# Altium footprint library FujinLib.PcbLib: 106 footprints (part 3 of 7)
Each footprint in its own frame and in the unit in brackets; x right, y up, seen from the top. Pads: shape width x height; smd on the part's side, far side on the other; paste and mask are expansions set on the pad; w line width, h text height; cw(c..) or ccw(c..) is an arc to the next point about the centre after c.
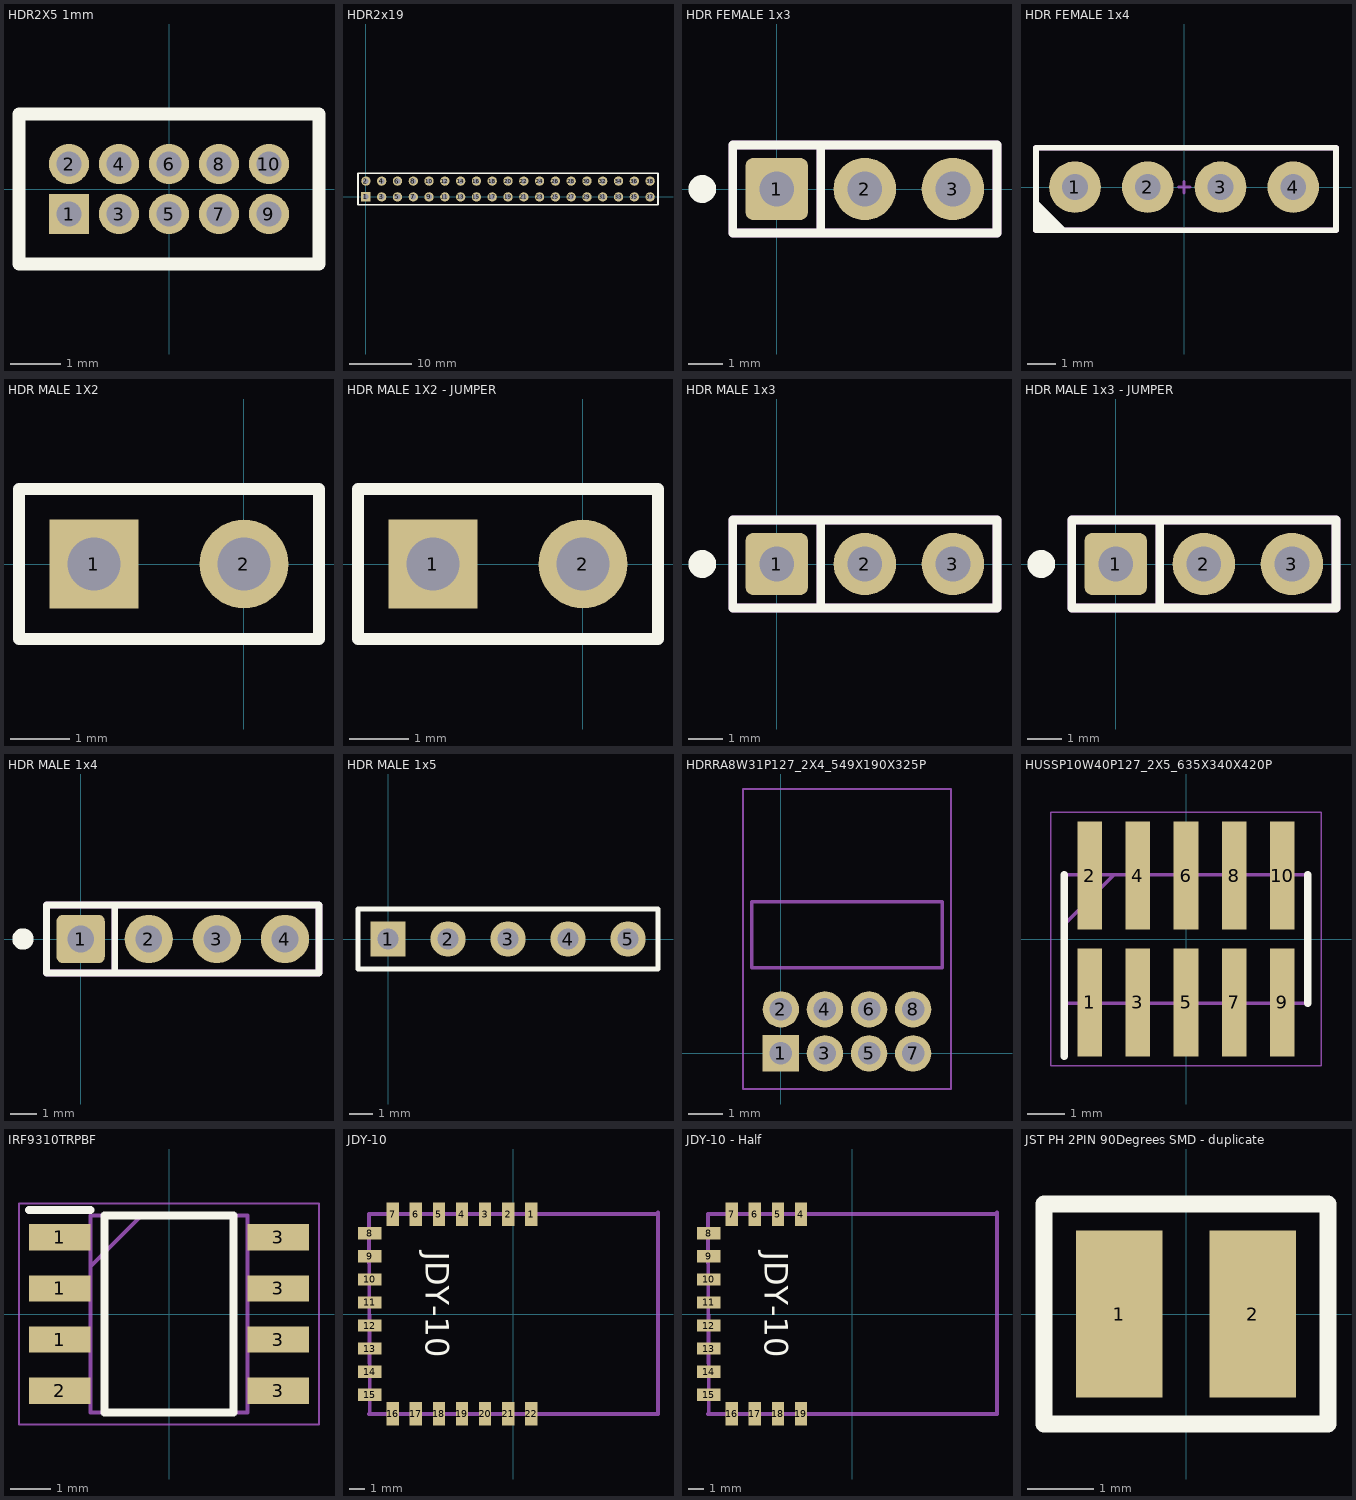
[diagram p2: the footprints below, top view; thin cyan lines are the x and y axes]

## HDR2X5 1mm [mm] "HDR2X5 1mm"
pads (10):
  rect 0.8x0.8 hole 0.5: 1(-2,-0.5)
  round 0.8 hole 0.5: 2(-2,0.5) 3(-1,-0.5) 4(-1,0.5) 5(0,-0.5) 6(0,0.5) 7(1,-0.5) 8(1,0.5) 9(2,-0.5) 10(2,0.5)
Top Overlay:
  lines w0.254: -3,-1.5 -3,1.5 3,1.5 3,-1.5 -3,-1.5

## HDR2x19 [mm]
pads (38):
  rect 1.5x1.5 hole 0.9: 1(0,0)
  round 1.5 hole 0.9: 2(0,2.54) 3(2.54,0) 4(2.54,2.54) 5(5.08,0) 6(5.08,2.54) 7(7.62,0) 8(7.62,2.54) 9(10.16,0) 10(10.16,2.54) 11(12.7,0) 12(12.7,2.54) 13(15.24,0) 14(15.24,2.54) 15(17.78,0) 16(17.78,2.54) 17(20.32,0) 18(20.32,2.54) 19(22.86,0) 20(22.86,2.54) 21(25.4,0) 22(25.4,2.54) 23(27.94,0) 24(27.94,2.54) 25(30.48,0) 26(30.48,2.54) 27(33.02,0) 28(33.02,2.54) 29(35.56,0) 30(35.56,2.54) 31(38.1,0) 32(38.1,2.54) 33(40.64,0) 34(40.64,2.54) 35(43.18,0) 36(43.18,2.54) 37(45.72,0) 38(45.72,2.54)
Top Overlay:
  lines w0.254: -1.27,-1.27 -1.27,3.81 46.99,3.81 46.99,-1.27 -1.27,-1.27
3D body "female_header_a-bl254-dg-g38d.stp": height 8.5, standoff -3.2, extent -1.395,-1.23 47.115,3.77

## HDR FEMALE 1x3 [mm] "PinHeader 1x3 TH Pitch 2.54mm"
height 9.5
pads (3):
  rrect25% 1.8x1.8 hole 1: 1(0,0)
  round 1.8 hole 1: 2(2.54,0) 3(5.08,0)
Top Overlay:
  circle w0.5: c-2.15,0 r0.15
  lines w0.254: 1.27,-1.27 1.27,1.27 -1.27,1.27 ; -1.27,1.27 6.35,1.27 6.35,-1.27 -1.27,-1.27 -1.27,1.27
Mechanical 3:
  lines w0.254: 1.27,-1.27 1.27,1.27 -1.27,1.27 ; -1.27,1.27 6.35,1.27 6.35,-1.27 -1.27,-1.27 -1.27,1.27
3D body "female_header_a-bl254-eg-g03d.stp": height 8.5, standoff -3.2, extent -1.435,-1.3 6.435,1.2

## HDR FEMALE 1x4 [mm] "Connector; Header; 4 Position"
pads (4):
  round 1.8 hole 0.9: 1(-3.81,0) 2(-1.27,0) 3(1.27,0) 4(3.81,0)
Top Overlay:
  region: -5.17,-1.5 -4.572,-1.5 -4.088,-1.5 -5.17,-0.418
  lines w0.2: -5.17,-1.5 5.3,-1.5 5.3,1.37 -5.17,1.37 -5.17,-1.5
Mechanical 15:
  lines w0.1: -0.2,0 0.2,0 ; 0,-0.2 0,0.2
  lines w0.2: -5.17,-1.5 -5.17,1.37 5.3,1.37 5.3,-1.5 -5.17,-1.5
Mechanical 29:
  text "1" at -2.794,-1.143 h0.5
3D body "HDR FEMALE 1x4.STEP": height 8.5, standoff -2.09, extent -5,-1.3 5.16,1.24

## HDR MALE 1X2 [mm]
pads (2):
  rect 1.5x1.5 hole 0.9: 1(-2.54,0)
  round 1.5 hole 0.9: 2(0,0)
Top Overlay:
  lines w0.2: -3.81,-1.27 -3.81,1.27 1.27,1.27 1.27,-1.27 -3.81,-1.27
3D body "pin_header_aw140-eg-g02d.stp": height 8.2, standoff -3, extent -3.91,-1.253 1.17,1.246

## HDR MALE 1X2 - JUMPER [mm]
pads (2):
  rect 1.5x1.5 hole 0.9: 1(-2.54,0)
  round 1.5 hole 0.9: 2(0,0)
Top Overlay:
  lines w0.2: -3.81,-1.27 -3.81,1.27 1.27,1.27 1.27,-1.27 -3.81,-1.27
3D body "pin_header_aw140-eg-g02d.stp": height 8.2, standoff -3, extent -3.91,-1.253 1.17,1.246
3D body "jumper_aksnt_g-black.stp": height 7.25, standoff 2.75, extent -3.77,-1.2 1.23,1.2

## HDR MALE 1x3 [mm] "PinHeader 1x3 TH Pitch 2.54mm"
height 9.5
pads (3):
  rrect25% 1.8x1.8 hole 1: 1(0,0)
  round 1.8 hole 1: 2(2.54,0) 3(5.08,0)
Top Overlay:
  circle w0.5: c-2.15,0 r0.15
  lines w0.254: 1.27,-1.27 1.27,1.27 -1.27,1.27 ; -1.27,1.27 6.35,1.27 6.35,-1.27 -1.27,-1.27 -1.27,1.27
Mechanical 3:
  lines w0.254: 1.27,-1.27 1.27,1.27 -1.27,1.27 ; -1.27,1.27 6.35,1.27 6.35,-1.27 -1.27,-1.27 -1.27,1.27
3D body "Pin Header 1x3 TH Pitch 2.54mm.stp": height 9.5, standoff -3.2, extent -1.27,-1.27 6.35,1.27

## HDR MALE 1x3 - JUMPER [mm] "PinHeader 1x3 TH Pitch 2.54mm"
height 9.5
pads (3):
  rrect25% 1.8x1.8 hole 1: 1(0,0)
  round 1.8 hole 1: 2(2.54,0) 3(5.08,0)
Top Overlay:
  circle w0.5: c-2.15,0 r0.15
  lines w0.254: 1.27,-1.27 1.27,1.27 -1.27,1.27 ; -1.27,1.27 6.35,1.27 6.35,-1.27 -1.27,-1.27 -1.27,1.27
Mechanical 3:
  lines w0.254: 1.27,-1.27 1.27,1.27 -1.27,1.27 ; -1.27,1.27 6.35,1.27 6.35,-1.27 -1.27,-1.27 -1.27,1.27
3D body "jumper_aksnt_g-black.stp": height 7.25, standoff 2.75, extent -1.23,-1.2 3.77,1.2
3D body "Pin Header 1x3 TH Pitch 2.54mm.stp": height 9.5, standoff -3.2, extent -1.27,-1.27 6.35,1.27

## HDR MALE 1x4 [mm] "PinHeader 1x4 TH Pitch 2.54mm"
height 9.5
pads (4):
  rrect25% 1.8x1.8 hole 1: 1(0,0)
  round 1.8 hole 1: 2(2.54,0) 3(5.08,0) 4(7.62,0)
Top Overlay:
  circle w0.5: c-2.15,0 r0.15
  lines w0.254: 1.27,-1.27 1.27,1.27 -1.27,1.27 ; -1.27,1.27 8.89,1.27 8.89,-1.27 -1.27,-1.27 -1.27,1.27
Mechanical 3:
  lines w0.254: 1.27,-1.27 1.27,1.27 -1.27,1.27 ; -1.27,1.27 8.89,1.27 8.89,-1.27 -1.27,-1.27 -1.27,1.27
3D body "Pin Header 1x4 TH Pitch 2.54mm.stp": height 9.5, standoff -3.2, extent -1.27,-1.27 8.89,1.27

## HDR MALE 1x5 [mm]
pads (5):
  rect 1.5x1.5 hole 0.9: 1(0,0)
  round 1.5 hole 0.9: 2(2.54,0) 3(5.08,0) 4(7.62,0) 5(10.16,0)
Top Overlay:
  lines w0.2: -1.27,-1.27 11.43,-1.27 11.43,1.27 -1.27,1.27 -1.27,-1.27
3D body "Pin Header 1x5 TH Pitch 2.54mm.stp": height 9.5, standoff -3.2, extent -1.27,-1.27 11.43,1.27

## HDRRA8W31P127_2X4_549X190X325P [mm]
pads (8):
  rect 1.05x1.05 hole 0.65: 1(0,0)
  round 1.05 hole 0.65: 2(0,1.27) 3(1.27,0) 4(1.27,1.27) 5(2.54,0) 6(2.54,1.27) 7(3.81,0) 8(3.81,1.27)
Mechanical 13:
  lines w0.1: -0.84,2.47 4.65,2.47 4.65,4.37 -0.84,4.37 -0.84,2.47
Mechanical 15:
  lines w0.05: -1.09,-1.025 -1.09,7.62 4.9,7.62 4.9,-1.025 -1.09,-1.025
3D body "852-10-008-20-001101.stp": height 3.25, standoff -3.2, extent -0.84,-0.155 4.65,7.37

## HUSSP10W40P127_2X5_635X340X420P [mm]
pads (10):
  rect 0.65x2.85 smd: 1(-2.54,-1.675) 2(-2.54,1.675) 3(-1.27,-1.675) 4(-1.27,1.675) 5(0,-1.675) 6(0,1.675) 7(1.27,-1.675) 8(1.27,1.675) 9(2.54,-1.675) 10(2.54,1.675)
Top Overlay:
  lines w0.2: -3.215,-3.1 -3.215,1.7 ; 3.215,-1.7 3.215,1.7
Mechanical 13:
  lines w0.1: -3.175,0.43 -1.905,1.7 ; -3.175,-1.7 -3.175,1.7 3.175,1.7 3.175,-1.7 -3.175,-1.7
Mechanical 15:
  lines w0.05: -3.575,-3.35 -3.575,3.35 3.575,3.35 3.575,-3.35 -3.575,-3.35
3D body "M50-3600542R.stp": height 5.13, standoff 0, extent -3.325,-2.75 3.325,2.75

## IRF9310TRPBF [mm]
pads (8):
  rect 1.525x0.65 smd: 1(-2.712,-0.635) 1(-2.712,0.635) 1(-2.712,1.905) 2(-2.712,-1.905) 3(2.712,-1.905) 3(2.712,-0.635) 3(2.712,0.635) 3(2.712,1.905)
Top Overlay:
  lines w0.2: -3.475,2.58 -1.95,2.58 ; -1.6,-2.45 -1.6,2.45 1.6,2.45 1.6,-2.45 -1.6,-2.45
Mechanical 13:
  lines w0.1: -1.95,1.18 -0.68,2.45 ; -1.95,-2.45 -1.95,2.45 1.95,2.45 1.95,-2.45 -1.95,-2.45
Mechanical 15:
  lines w0.05: -3.725,-2.75 -3.725,2.75 3.725,2.75 3.725,-2.75 -3.725,-2.75
3D body "NE555DR.stp": height 1.75, standoff 0, extent -3,-2.45 3,2.45

## JDY-10 [mm]
pads (22):
  rect 0.8x1.524 smd: 1(1.15,6.5) 2(-0.35,6.5) 3(-1.85,6.5) 4(-3.35,6.5) 5(-4.85,6.5) 6(-6.35,6.5) 7(-7.85,6.5) 16(-7.85,-6.5) 17(-6.35,-6.5) 18(-4.85,-6.5) 19(-3.35,-6.5) 20(-1.85,-6.5) 21(-0.35,-6.5) 22(1.15,-6.5)
  rect 1.524x0.8 smd: 8(-9.35,5.25) 9(-9.35,3.75) 10(-9.35,2.25) 11(-9.35,0.75) 12(-9.35,-0.75) 13(-9.35,-2.25) 14(-9.35,-3.75) 15(-9.35,-5.25)
Top Overlay:
  text "JDY-10" at -5.715,4.064 h1.52
Mechanical 15:
  lines w0.254: -9.398,-6.5 9.398,-6.5 ; -9.35,-6.5 -9.398,6.5 9.35,6.5 ; 9.398,-6.396 9.398,6.604
3D body "User Library-JDY-10.STEP": height 1.5, standoff 0.05, extent -9.35,-6.5 9.35,6.5

## JDY-10 - Half [mm]
pads (16):
  rect 0.8x1.524 smd: 4(-3.35,6.5) 5(-4.85,6.5) 6(-6.35,6.5) 7(-7.85,6.5) 16(-7.85,-6.5) 17(-6.35,-6.5) 18(-4.85,-6.5) 19(-3.35,-6.5)
  rect 1.524x0.8 smd: 8(-9.35,5.25) 9(-9.35,3.75) 10(-9.35,2.25) 11(-9.35,0.75) 12(-9.35,-0.75) 13(-9.35,-2.25) 14(-9.35,-3.75) 15(-9.35,-5.25)
Top Overlay:
  text "JDY-10" at -5.715,4.064 h1.52
Mechanical 15:
  lines w0.254: -9.398,-6.5 9.398,-6.5 ; -9.35,-6.5 -9.398,6.5 9.35,6.5 ; 9.398,-6.396 9.398,6.604
3D body "User Library-JDY-10.STEP": height 1.5, standoff 0.05, extent -9.35,-6.5 9.35,6.5

## JST PH 2PIN 90Degrees SMD - duplicate [mm]
pads (2):
  rect 1.3x2.5 smd: 1(-1,0) 2(1,0)
Top Overlay:
  lines w0.254: -2.127,-1.651 2.127,-1.651 2.127,1.651 -2.127,1.651 -2.127,-1.651
3D body "JST - PH - SMD (R) - 2Pin - 2.00mm.stp": height 5.38, standoff 0, extent -4.074,-7.493 4.073,0.762